# Altium footprint library PcbLib1.PcbLib: 17 footprints (part 1 of 2)
Each footprint in its own frame and in the unit in brackets; x right, y up, seen from the top. Pads: shape width x height; smd on the part's side, far side on the other; paste and mask are expansions set on the pad; w line width, h text height; cw(c..) or ccw(c..) is an arc to the next point about the centre after c.
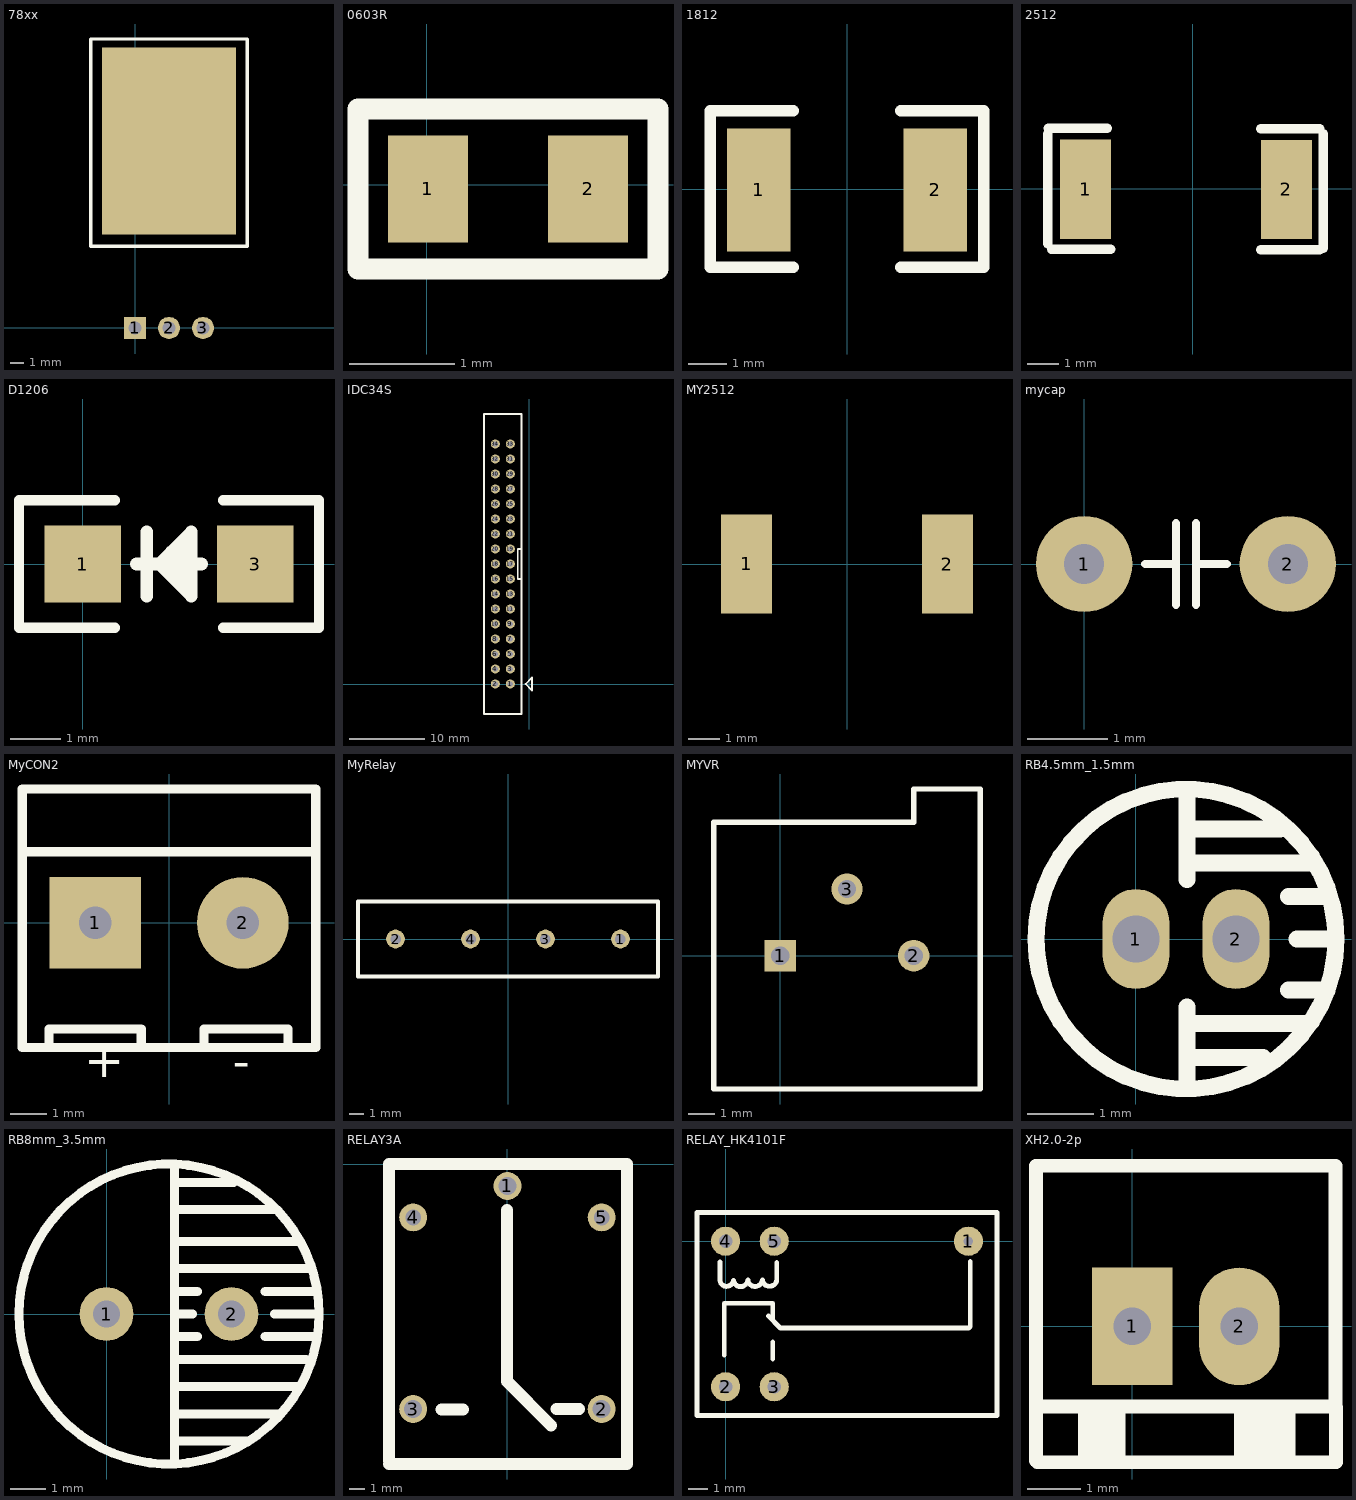
[diagram p0: the footprints below, top view; thin cyan lines are the x and y axes]

## 78xx [mil]
pads (4):
  rect 65x65 hole 39.37: 1(0,0)
  round 65 hole 39.37: 2(100,0) 3(200,0)
  rect 393.7x551.18 smd: ""(100,550)
Top Overlay:
  lines w10: -130,240 -130,850 330,850 330,240 -130,240

## 0603R [mil]
pads (2):
  rect 30x40 smd: 1(0.5,-1.59) 2(60.5,-1.59)
Top Overlay:
  lines w7.87: 86.64,-31.63 86.64,28.41 -25.65,28.41 -25.65,-31.59 86.64,-31.59

## 1812 [mm]
pads (2):
  rect 1.65x3.2 smd: 1(-2.3,-0.022) 2(2.3,-0.025)
Top Overlay:
  lines w0.305: -1.397,-2.032 -3.556,-2.032 -3.556,2.032 -1.397,2.032 ; 1.397,-2.032 3.556,-2.032 3.556,2.032 1.397,2.032

## 2512 [mm]
pads (2):
  rect 1.65x3.2 smd: 1(-3.45,-0.022) 2(3.03,-0.025)
Top Overlay:
  lines w0.305: -4.675,-1.775 -4.675,1.765 ; -4.655,1.95 -2.75,1.95 ; -4.55,-1.95 -2.645,-1.95 ; 2.195,1.925 4.1,1.925 ; 2.2,-1.975 4.105,-1.975 ; 4.225,-1.925 4.225,1.775

## D1206 [mil]
pads (2):
  rect 60x60 smd: 1(0,0) 3(135,0)
Top Overlay:
  lines w8: 25,-50 -50,-50 -50,50 25,50 ; 110,-50 185,-50 185,50 110,50
  lines w10: 42,0 93,0 ; 50,-25 50,25 ; 69.54,-5.81 69.54,9.54 ; 76.73,-13 76.73,16.73 ; 60,0 85,-25 85,25 60,0

## IDC34S [mm]
pads (34):
  round 1.2 hole 0.7: 1(-2.504,0.016) 2(-4.504,0.016) 3(-2.504,2.016) 4(-4.504,2.016) 5(-2.504,4.016) 6(-4.504,4.016) 7(-2.504,6.016) 8(-4.504,6.016) 9(-2.504,8.016) 10(-4.504,8.016) 11(-2.504,10.016) 12(-4.504,10.016) 13(-2.504,12.016) 14(-4.504,12.016) 15(-2.504,14.016) 16(-4.504,14.016) 17(-2.504,16.016) 18(-4.504,16.016) 19(-2.504,18.016) 20(-4.504,18.016) 21(-2.504,20.016) 22(-4.504,20.016) 23(-2.504,22.016) 24(-4.504,22.016) 25(-2.504,24.016) 26(-4.504,24.016) 27(-2.504,26.016) 28(-4.504,26.016) 29(-2.504,28.016) 30(-4.504,28.016) 31(-2.504,30.016) 32(-4.504,30.016) 33(-2.504,32.016) 34(-4.504,32.016)
Top Overlay:
  lines w0.254: -1.004,14.008 -1.513,14.008 -1.513,18.008 -1.004,18.008 ; -6.004,-3.991 -6.004,36.009 -1.004,36.009 -1.004,-3.991 -6.005,-3.991 ; -0.481,0.009 0.369,-0.841 0.369,0.859 -0.481,0.009

## MY2512 [mm]
pads (2):
  rect 1.65x3.2 smd: 1(-3.247,0.004) 2(3.233,0)

## mycap [mm]
pads (2):
  round 1.2 hole 0.5: 1(0,0) 2(2.54,0)
Top Overlay:
  lines w0.1: 0.762,0 1.143,0 ; 1.143,-0.508 1.143,0.508 ; 1.397,-0.508 1.397,0.508 ; 1.397,0 1.778,0

## MyCON2 [mm]
pads (2):
  rect 2.524x2.524 hole 0.9: 1(-2.032,0)
  round 2.524 hole 0.9: 2(2.032,0)
Top Overlay:
  lines w0.254: -4.039,1.956 4.013,1.956 ; -3.302,-3.429 -3.302,-2.921 -0.762,-2.921 -0.762,-3.429 ; 0.965,-3.378 0.965,-2.921 3.277,-2.921 3.277,-3.429 ; -4.039,-3.429 -4.039,3.683 4.039,3.683 4.039,-3.429 -4.039,-3.429
  text "+" at -2.337,-4.572 h1.65
  text "-" at 1.753,-4.572 h1.65

## MyRelay [mil]
pads (4):
  round 50 hole 28: 1(300,0) 2(-300,0) 3(100,0) 4(-100,0)
Top Overlay:
  lines w10: -100,100 150,100 ; -400,-100 -400,100 400,100 400,-100 150,-100 -250,-100 -400,-100

## MYVR [mm]
pads (3):
  rect 1.2x1.2 hole 0.7: 1(0,0)
  round 1.2 hole 0.7: 2(5.08,0) 3(2.54,2.54)
Top Overlay:
  lines w0.2: -2.54,-5.08 -2.54,5.08 5.08,5.08 5.08,6.35 7.62,6.35 7.62,-5.08 -2.54,-5.08

## RB4.5mm_1.5mm [mm] "cap"
pads (2):
  oval 1x1.5 hole 0.711: 1(0,0) 2(1.5,0)
Top Overlay:
  circle w0.254: c0.75,0 r2.25
  lines w0.254: 0.762,-2.159 0.762,-1.016 ; 0.762,-1.778 1.905,-1.778 ; 0.762,-1.27 2.54,-1.27 ; 0.762,0.889 0.762,1.143 ; 0.762,1.651 2.159,1.651 ; 0.762,2.159 0.762,1.143 ; 2.286,-0.762 2.794,-0.762 ; 2.286,0.635 2.794,0.635 ; 2.413,0 3,0 ; 2.667,1.143 0.762,1.143

## RB8mm_3.5mm [mm]
pads (2):
  round 1.5 hole 0.75: 1(0,0) 2(3.5,0)
Top Overlay:
  circle w0.254: c1.75,0 r4.2
  lines w0.254: 1.905,-4.191 1.905,4.064 ; 1.905,-3.556 3.937,-3.556 ; 1.905,-2.794 4.826,-2.794 ; 1.905,-2.032 5.334,-2.032 ; 1.905,-1.27 5.588,-1.27 ; 1.905,-0.635 2.54,-0.635 ; 1.905,0 2.413,0 ; 1.905,0.635 2.54,0.635 ; 1.905,1.27 5.715,1.27 ; 1.905,2.032 5.334,2.032 ; 1.905,2.921 4.699,2.921 ; 1.905,3.683 3.556,3.683 ; 4.445,-0.635 5.842,-0.635 ; 4.445,0.635 5.842,0.635 ; 4.699,0 5.95,0

## RELAY3A [mil]
pads (5):
  round 70 hole 45: 1(0,-55.12) 2(236.22,-614.17) 3(-236.22,-614.17)
  round 70 hole 39.37: 4(-236.22,-133.86) 5(236.22,-133.86)
Top Overlay:
  lines w29.72: -297.24,-751.97 300,-751.97 ; -297.24,0 300,0
  lines w30: -297.24,-743.72 -297.24,0 ; -165,-615 -111,-615 ; -1,-115 -1,-545 109,-655 ; 123,-614 180,-614 ; 300,-751.97 300,0

## RELAY_HK4101F [mil] "汇科HK4101F继电器"
pads (5):
  round 60 hole 19.68: 1(500,0)
  round 60 hole 27.56: 2(0,-300) 3(100,-300) 4(0,0) 5(100,0)
Top Overlay:
  lines w10: -12,-43 -12,-79 ccw(c2.04,-79) 15.99,-80.47 ccw(c30.87,-78.54) 45.78,-80.2 ccw(c60.65,-78.27) 75.56,-79.92 ccw(c90.44,-77.99) 105.35,-79.65 105.35,-44 ; -3,-235 -3,-128 97,-128 97,-159 ; 88,-154 113,-179 501,-179 504,-176 504,-42 ; 97,-243 97,-208 ; 559,-359.06 -59.06,-359.06 -59.06,59.06 559.06,59.06 559.06,-359.06

## XH2.0-2p [mm]
pads (2):
  rect 1.5x2.2 hole 0.7: 1(0,0)
  oval 1.5x2.2 hole 0.7: 2(2,0)
Top Overlay:
  rectangle: 1.905,-2.54 3.048,-1.5
  rectangle: -0.889,-2.54 -0.127,-1.5
  lines w0.254: -0.889,-2.54 -0.889,-1.5 ; -1.8,-1.5 3.8,-1.5 ; -1.8,-1.5 -1.8,3 3.8,3 3.8,-1.5 ; -1.8,-1.5 -1.8,-2.518 -1.778,-2.54 3.81,-2.54 3.81,-1.51 3.8,-1.5